# Altium footprint library ACTION_非标准杂项.pcblib: 82 footprints (part 3 of 6)
Each footprint in its own frame and in the unit in brackets; x right, y up, seen from the top. Pads: shape width x height; smd on the part's side, far side on the other; paste and mask are expansions set on the pad; w line width, h text height; cw(c..) or ccw(c..) is an arc to the next point about the centre after c.
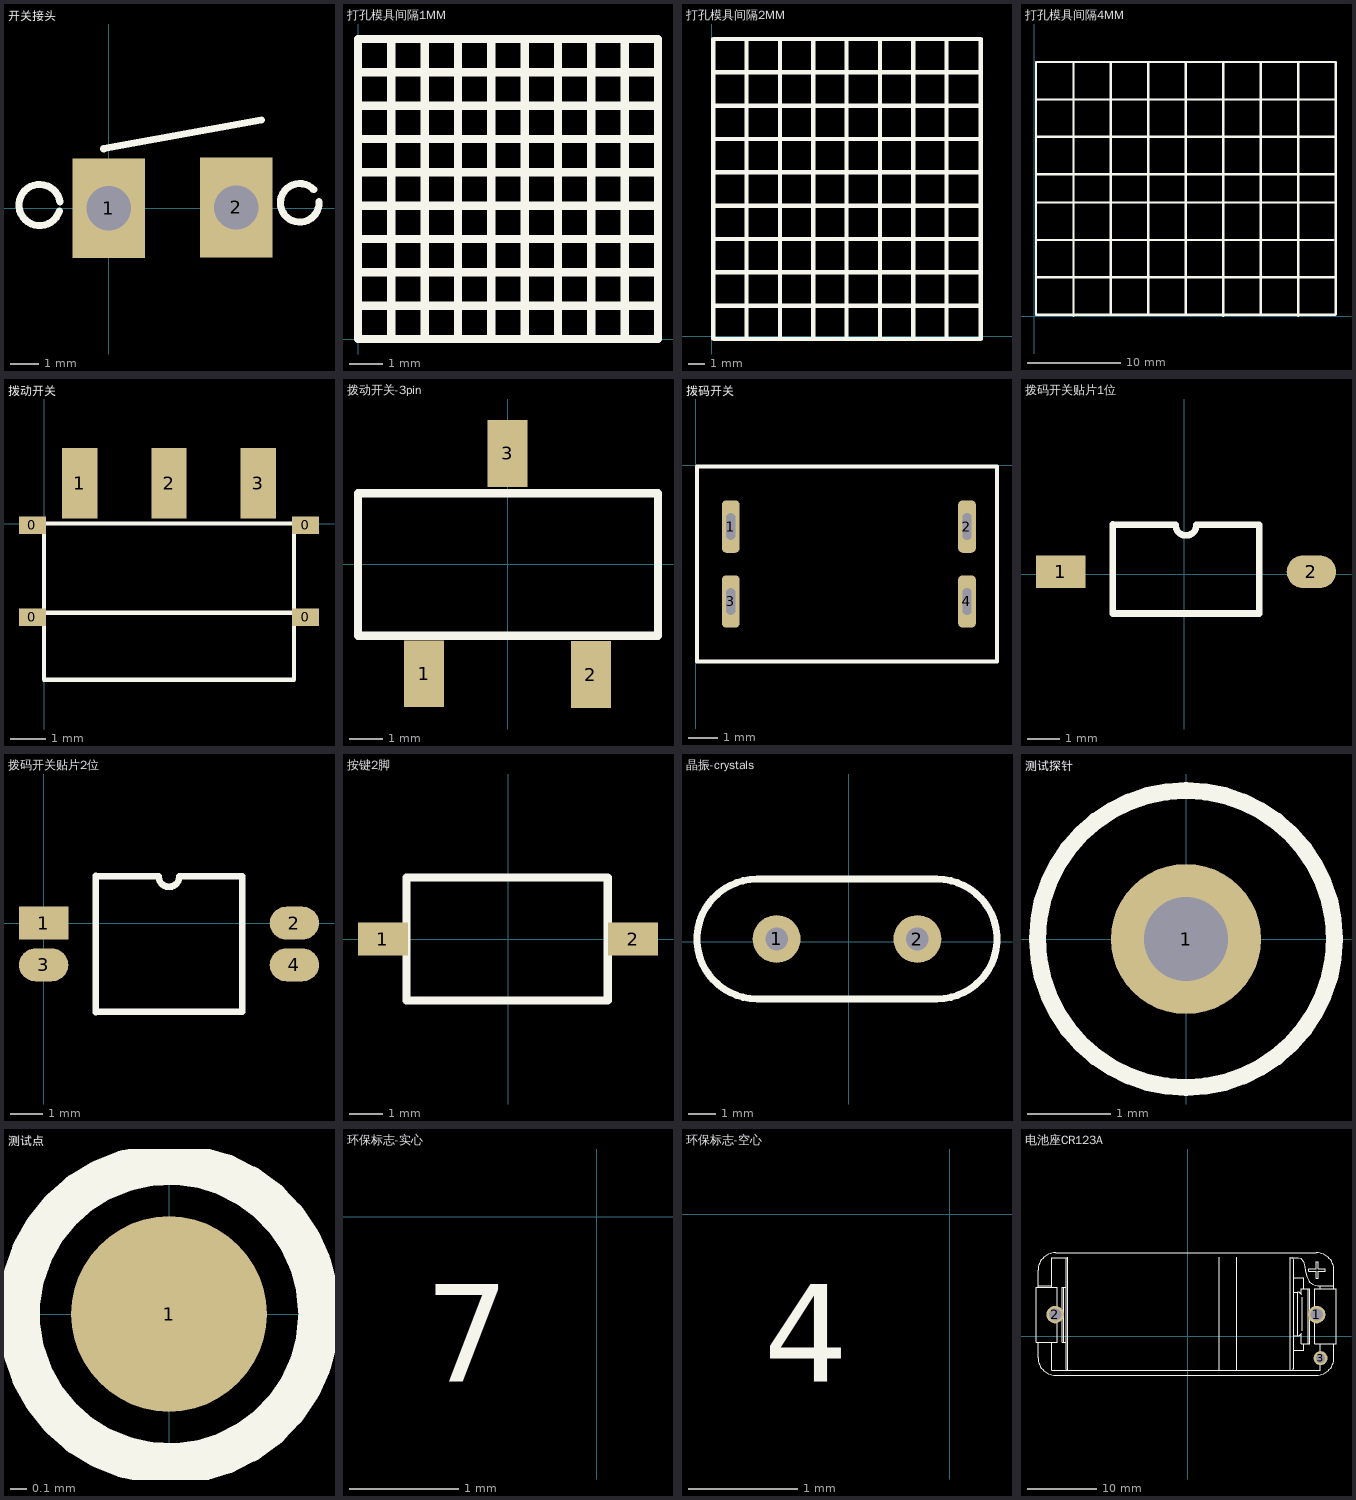
[diagram p2: the footprints below, top view; thin cyan lines are the x and y axes]

## 开关接头 [mil]
pads (2):
  rect 101.5x139.06 hole 61.69: 1(0,0) 2(178,1)
Top Overlay:
  lines w10: -68.81,-3.81 cw(c-96.42,4.37) -68,9 ; -7,83 213,123 ; 286,26 ccw(c266.5,7.43) 293.37,9.22

## 打孔模具间隔1MM [mm]
Top Overlay:
  lines w0.254: 0,1 9,1 ; 0,2 9,2 ; 0,3 9,3 ; 0,4 9,4 ; 0,5 9,5 ; 0,6 9,6 ; 0,7 9,7 ; 0,8 9,8 ; 1,0 1,9 ; 2,0 2,9 ; 3,0 3,9 ; 4,0 4,9 ; 5,0 5,9 ; 6,0 6,9 ; 7,0 7,9 ; 8,0 8,9 ; 0,0 9,0 9,9 0,9 0,0

## 打孔模具间隔2MM [mm]
Top Overlay:
  lines w0.254: 0.076,1.845 16.027,1.845 ; 0.076,3.845 16.104,3.845 ; 0.076,5.845 16.027,5.845 ; 0.076,7.845 16.002,7.845 ; 0.076,9.845 16.104,9.845 ; 0.076,11.845 16.078,11.845 ; 0.076,13.845 16.053,13.845 ; 0.076,15.845 16.053,15.845 ; 2.076,-0.076 2.076,17.845 ; 4.076,-0.127 4.076,17.845 ; 6.076,-0.076 6.076,17.845 ; 8.076,-0.076 8.076,17.845 ; 10.076,0 10.076,17.845 ; 12.076,-0.076 12.076,17.845 ; 14.076,-0.127 14.076,17.845 ; 0.076,-0.127 0.076,17.845 16.129,17.845 16.129,-0.155 0.105,-0.155 0.076,-0.127

## 打孔模具间隔4MM [mm]
Top Overlay:
  lines w0.254: 0.178,0.169 32.131,0.169 ; 0.178,0.178 0.178,27.169 32.055,27.169 ; 0.178,4.169 32.207,4.169 ; 0.178,8.169 31.902,8.169 ; 0.178,12.169 32.055,12.169 ; 0.178,15.169 32.055,15.169 ; 0.178,19.169 32.131,19.169 ; 0.178,23.169 32.131,23.169 ; 4.178,0.051 4.178,27.169 ; 8.178,0.305 8.178,27.169 ; 12.178,0.178 12.178,27.169 ; 16.178,0.406 16.178,27.169 ; 20.178,0.051 20.178,27.169 ; 24.178,0.229 24.178,27.169 ; 28.178,0.051 28.178,27.169 ; 32.178,0.229 32.178,27.169

## 拨动开关 [mil]
pads (7):
  rect 30x19.68 smd: 0(-13,-105) 0(-13,-2) 0(293,-105) 0(293,-2)
  rect 39.37x78.74 smd: 1(40,45) 2(140,45) 3(240,45)
Top Overlay:
  lines w4.92: 0,-98.43 0,0 279.53,0 ; 0.47,-100 280,-100 280,-1.57 ; 279.53,-100 0,-100 0,-175 280,-175 280,-101.57

## 拨动开关-3pin [mm]
pads (3):
  rect 1.2x2 smd: 1(-2.5,-3.289) 2(2.5,-3.315) 3(0,3.315)
Top Overlay:
  lines w0.254: -4.483,-2.146 -4.483,2.121 4.483,2.121 ; -4.458,-2.146 4.509,-2.146 4.509,2.121

## 拨码开关 [mil]
pads (4):
  rrect50% 23.62x70 hole 11.81 slot 35.43 at 90 deg: 1(47,-82) 2(362,-82) 3(47,-182) 4(362,-182)
Top Overlay:
  lines w5: 2,-262 402,-262 402,-2 2,-2 2,-262

## 拨码开关贴片1位 [mm]
pads (2):
  rect 1.5x1 smd: 1(-3.759,0.076)
  oval 1.5x1 smd: 2(3.861,0.076)
Top Overlay:
  lines w0.2: -2.174,1.499 -0.267,1.499 ccw(c0.051,1.499) 0.368,1.499 2.276,1.499 2.276,-1.194 -2.174,-1.194 -2.174,1.511

## 拨码开关贴片2位 [mm]
pads (4):
  rect 1.5x1 smd: 1(0,0)
  oval 1.5x1 smd: 2(7.62,0) 3(0,-1.27) 4(7.62,-1.27)
Top Overlay:
  lines w0.2: 1.585,-2.705 1.585,1.435 ; 1.585,-2.692 6.035,-2.692 6.035,1.422 4.127,1.422 cw(c3.81,1.422) 3.492,1.422 1.585,1.422

## 按键2脚 [mm]
pads (2):
  rect 1.5x1 smd: 1(-3.772,0) 2(3.772,0)
Top Overlay:
  lines w0.254: -3.061,-1.854 3.01,-1.854 3.01,1.854 -3.061,1.854 -3.061,-1.854
3D body: height 2, standoff 0, extent -3.073,-1.88 3.023,1.88

## 晶振-crystals [mil]
pads (2):
  round 68 hole 32: 1(-102.36,3.94) 2(97.64,3.94)
Top Overlay:
  lines w10: -130.36,-81.07 cw(c-130.36,3.94) -130.36,88.94 125.64,88.94 cw(c125.64,3.94) 125.64,-81.07 -130.36,-81.07
3D body "晶振.STEP": height 118.11, standoff -78.74, extent -235.22,-74.8 237.22,82.68

## 测试探针 [mm] "Keystone Compact loops"
height 5.588
pads (1):
  round 1.8 hole 1: 1(0,0)
Top Overlay:
  circle w0.203: c0,0 r1.778
Mechanical 5:
  circle w0.127: c0,0 r1.796
3D body "Keystone_5006.stp": height 5.72, standoff -3.3, extent -1.613,-1.603 1.587,1.596

## 测试点 [mm]
pads (1):
  round 1.2 smd: 1(0,0)
Top Overlay:
  circle w0.254: c0,0 r0.92

## 环保标志-实心 [mm]
Top Overlay:
  text "7" at -1.575,-1.803 h1.52

## 环保标志-空心 [mm]
Top Overlay:
  text "4" at -1.702,-1.829 h1.52

## 电池座CR123A [mil]
pads (3):
  round 100 hole 70: 1(736,124.5) 2(-758,124.5)
  round 80 hole 53: 3(758,-124.5)
Top Overlay:
  lines w2.13: -855.83,-33.25 -855.83,-122.24 ccw(c-755.83,-122.24) -755.83,-222.24 734.17,-222.24 ccw(c734.17,-122.24) 834.17,-122.24 834.17,-42.06 ; -855.83,281.71 -855.83,289.53 ; -777.09,-33.25 -777.09,-194.68 755.43,-194.68 755.43,-42.06 ; -777.09,281.71 -777.09,289.53 ; -695.79,-189.56 ccw(c-685.79,-189.56) -694.38,-194.68 ; -695.79,-188.34 -695.79,445.44 cw(c-685.79,445.44) -694.59,450.2 ; -695.79,-33.25 -710.23,-33.25 ; -695.79,281.71 -710.23,281.71 ; -688.43,450.2 -777.09,450.2 -777.09,289.53 ; -685.79,-194.68 -685.79,450.56 ; 179.21,-194.68 179.21,450.56 ; 279.21,-194.68 279.21,450.56 ; 584.21,-194.68 584.21,450.56 ; 587.96,450.2 630.12,450.2 643.3,445.11 649.03,440.86 653.89,435.62 658.53,428.24 661.99,420.21 667.88,398.32 671.65,375.83 675.7,353.41 679.04,340.54 683.73,328.13 688.92,318.82 695.56,310.49 703.64,303.49 712.81,297.96 726.4,292.74 740.67,289.66 755.43,288.19 ; 597.3,-194.68 ccw(c584.21,-179.56) 604.21,-179.56 ; 597.7,450.2 cw(c584.21,435.44) 604.21,435.44 604.21,-178.38 ; 604.21,-78.97 660.78,-78.97 660.78,-42.06 ; 604.21,2.94 627.21,2.94 ; 604.21,252.94 627.21,252.94 ; 604.21,334.49 660.78,334.49 660.78,272.9 ; 648.81,-42.06 648.81,16.33 ; 648.81,239.76 648.81,272.9 ; 648.86,-42.06 688.57,-42.06 ; 649,272.9 688.57,272.9 ; 650.26,18.26 cw(c627.21,27.94) 627.21,2.94 ; 650.26,237.63 ccw(c627.21,227.94) 627.21,252.94 ; 652.21,31.88 652.21,223.97 ; 755.43,272.9 755.43,289.53 834.17,289.53 ; 834.17,272.9 834.17,289.53 ; -855.83,289.53 -855.83,377.76 cw(c-755.83,377.76) -755.83,477.76 734.17,477.76 cw(c734.17,377.76) 834.17,377.76 834.17,289.53 ; -855.83,289.53 -777.09,289.53 ; -710.23,-33.25 -719.01,-33.25 -719.01,281.71 -710.23,281.71 ; -710.23,-33.25 -710.23,281.71 ; 627.21,2.94 627.21,252.94 ; 688.57,-42.06 697.35,-42.06 697.35,272.9 688.57,272.9 ; 688.57,-42.06 688.57,272.9 ; -867.64,-33.25 -746.11,-33.25 -746.11,281.71 -867.64,281.71 -867.64,-33.25 ; 691.75,373.2 732.38,373.2 732.38,332.57 744.75,332.57 744.75,373.2 785.38,373.2 785.38,385.56 744.75,385.56 744.75,426.2 732.38,426.2 732.38,385.56 691.75,385.56 691.75,373.2 ; 724.45,-42.06 845.98,-42.06 845.98,272.9 724.45,272.9 724.45,-42.06
3D body "User Library-BH123A_assembly-1.STEP": height 694, standoff -158.38, extent -868.81,-224.5 844.81,475.5
3D body: height 10, standoff 0, extent -21,125.5 -21,125.5